# Altium footprint library BASIC.PcbLib: 244 footprints (part 5 of 16)
Each footprint in its own frame and in the unit in brackets; x right, y up, seen from the top. Pads: shape width x height; smd on the part's side, far side on the other; paste and mask are expansions set on the pad; w line width, h text height; cw(c..) or ccw(c..) is an arc to the next point about the centre after c.
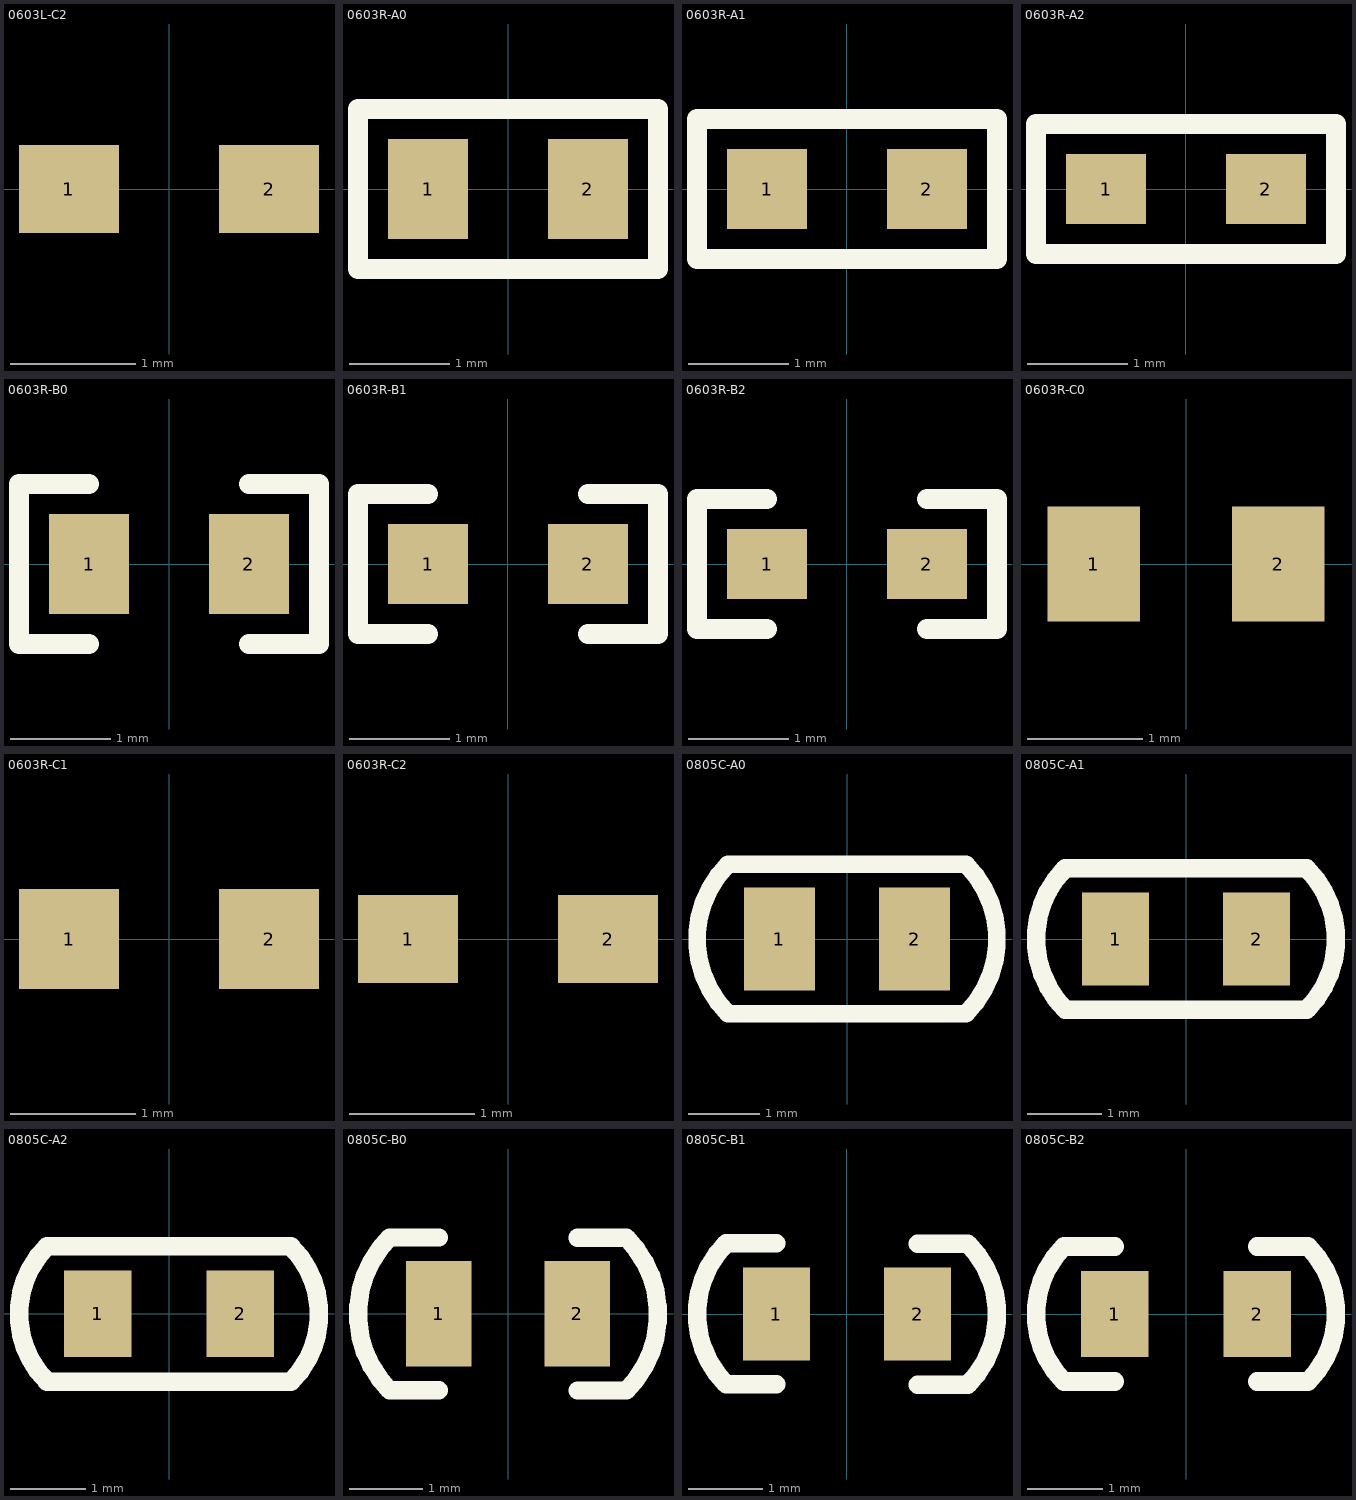
[diagram p4: the footprints below, top view; thin cyan lines are the x and y axes]

## 0603L-C2 [mm]
pads (2):
  rect 0.8x0.7 smd: 1(-0.8,0) 2(0.8,0)
3D body "tfpt0603l1200fv.stp": height 0.45, standoff 0, extent -0.8,-0.4 0.8,0.4

## 0603R-A0 [mm]
pads (2):
  rect 0.8x1 smd: 1(-0.8,0) 2(0.8,0)
Top Overlay:
  lines w0.2: -1.5,-0.8 1.5,-0.8 1.5,0.8 -1.5,0.8 -1.5,-0.8
3D body "RES0603-3.step": height 0.45, standoff 0, extent -0.8,-0.4 0.8,0.4

## 0603R-A1 [mm]
height 0.6
pads (2):
  rect 0.8x0.8 smd: 1(-0.8,0) 2(0.8,0)
Top Overlay:
  lines w0.2: -1.5,-0.7 1.5,-0.7 1.5,0.7 -1.5,0.7 -1.5,-0.7
3D body "RES0603-3.step": height 0.45, standoff 0, extent -0.8,-0.4 0.8,0.4

## 0603R-A2 [mm]
height 0.6
pads (2):
  rect 0.8x0.7 smd: 1(-0.8,0) 2(0.8,0)
Top Overlay:
  lines w0.2: -1.5,-0.65 1.5,-0.65 1.5,0.65 -1.5,0.65 -1.5,-0.65
3D body "RES0603-3.step": height 0.45, standoff 0, extent -0.8,-0.4 0.8,0.4

## 0603R-B0 [mm]
pads (2):
  rect 0.8x1 smd: 1(-0.8,0) 2(0.8,0)
Top Overlay:
  lines w0.2: -0.8,-0.8 -1.5,-0.8 -1.5,0.8 -0.8,0.8 ; 0.8,-0.8 1.5,-0.8 1.5,0.8 0.8,0.8
3D body "RES0603-3.step": height 0.45, standoff 0, extent -0.8,-0.4 0.8,0.4

## 0603R-B1 [mm]
height 0.6
pads (2):
  rect 0.8x0.8 smd: 1(-0.8,0) 2(0.8,0)
Top Overlay:
  lines w0.2: -0.8,-0.7 -1.5,-0.7 -1.5,0.7 -0.8,0.7 ; 0.8,-0.7 1.5,-0.7 1.5,0.7 0.8,0.7
3D body "RES0603-3.step": height 0.45, standoff 0, extent -0.8,-0.4 0.8,0.4

## 0603R-B2 [mm]
height 0.6
pads (2):
  rect 0.8x0.7 smd: 1(-0.8,0) 2(0.8,0)
Top Overlay:
  lines w0.2: -0.8,-0.65 -1.5,-0.65 -1.5,0.65 -0.8,0.65 ; 0.8,-0.65 1.5,-0.65 1.5,0.65 0.8,0.65
3D body "RES0603-3.step": height 0.45, standoff 0, extent -0.8,-0.4 0.8,0.4

## 0603R-C0 [mm]
pads (2):
  rect 0.8x1 smd: 1(-0.8,0) 2(0.8,0)
3D body "RES0603-3.step": height 0.45, standoff 0, extent -0.8,-0.4 0.8,0.4

## 0603R-C1 [mm]
height 0.6
pads (2):
  rect 0.8x0.8 smd: 1(-0.8,0) 2(0.8,0)
3D body "RES0603-3.step": height 0.45, standoff 0, extent -0.8,-0.4 0.8,0.4

## 0603R-C2 [mm]
height 0.6
pads (2):
  rect 0.8x0.7 smd: 1(-0.8,0) 2(0.8,0)
3D body "RES0603-3.step": height 0.45, standoff 0, extent -0.8,-0.4 0.8,0.4

## 0805C-A0 [mm]
pads (2):
  rect 1x1.45 smd: 1(-0.95,0) 2(0.95,0)
Top Overlay:
  lines w0.25: -1.675,-1.05 cw(c-0.625,0) -1.675,1.05 1.675,1.05 cw(c0.625,0) 1.675,-1.05 -1.675,-1.05
3D body "RES0805.step": height 0.55, standoff 0, extent -1,-0.624 1,0.626

## 0805C-A1 [mm]
pads (2):
  rect 0.9x1.25 smd: 1(-0.95,0) 2(0.95,0)
Top Overlay:
  lines w0.25: -1.629,0.954 ccw(c-0.673,0.002) -1.625,-0.954 1.625,-0.954 ccw(c0.671,0) 1.625,0.954 -1.629,0.954
3D body "RES0805.step": height 0.55, standoff 0, extent -1,-0.624 1,0.626

## 0805C-A2 [mm]
pads (2):
  rect 0.9x1.15 smd: 1(-0.95,0) 2(0.95,0)
Top Overlay:
  lines w0.25: -1.625,-0.903 1.625,-0.903 ccw(c0.725,-0.003) 1.625,0.897 ; -1.625,-0.9 cw(c-0.725,0) -1.625,0.9 1.625,0.9
3D body "RES0805.step": height 0.55, standoff 0, extent -1,-0.624 1,0.626

## 0805C-B0 [mm]
pads (2):
  rect 0.9x1.45 smd: 1(-0.95,0) 2(0.95,0)
Top Overlay:
  lines w0.25: -0.95,-1.05 -1.625,-1.05 cw(c-0.575,0) -1.625,1.05 -0.95,1.05 ; 0.953,-1.054 1.625,-1.054 ccw(c0.575,-0.004) 1.625,1.046 0.953,1.046
3D body "RES0805.step": height 0.55, standoff 0, extent -1,-0.624 1,0.626

## 0805C-B1 [mm]
pads (2):
  rect 0.9x1.25 smd: 1(-0.95,0) 2(0.95,0)
Top Overlay:
  lines w0.25: -0.952,-0.946 -1.625,-0.946 cw(c-0.675,0.004) -1.625,0.954 -0.952,0.954 ; 0.95,-0.95 1.625,-0.95 ccw(c0.675,0) 1.625,0.95 0.95,0.95
3D body "RES0805.step": height 0.55, standoff 0, extent -1,-0.624 1,0.626

## 0805C-B2 [mm]
pads (2):
  rect 0.9x1.15 smd: 1(-0.95,0) 2(0.95,0)
Top Overlay:
  lines w0.25: -0.95,-0.9 -1.625,-0.9 cw(c-0.725,0) -1.625,0.9 -0.95,0.9 ; 0.95,-0.9 1.625,-0.9 ccw(c0.725,0) 1.625,0.9 0.95,0.9
3D body "RES0805.step": height 0.55, standoff 0, extent -1,-0.624 1,0.626